# Altium footprint library PCB_IntegratedCircuit.PcbLib: 56 footprints (part 3 of 4)
Each footprint in its own frame and in the unit in brackets; x right, y up, seen from the top. Pads: shape width x height; smd on the part's side, far side on the other; paste and mask are expansions set on the pad; w line width, h text height; cw(c..) or ccw(c..) is an arc to the next point about the centre after c.
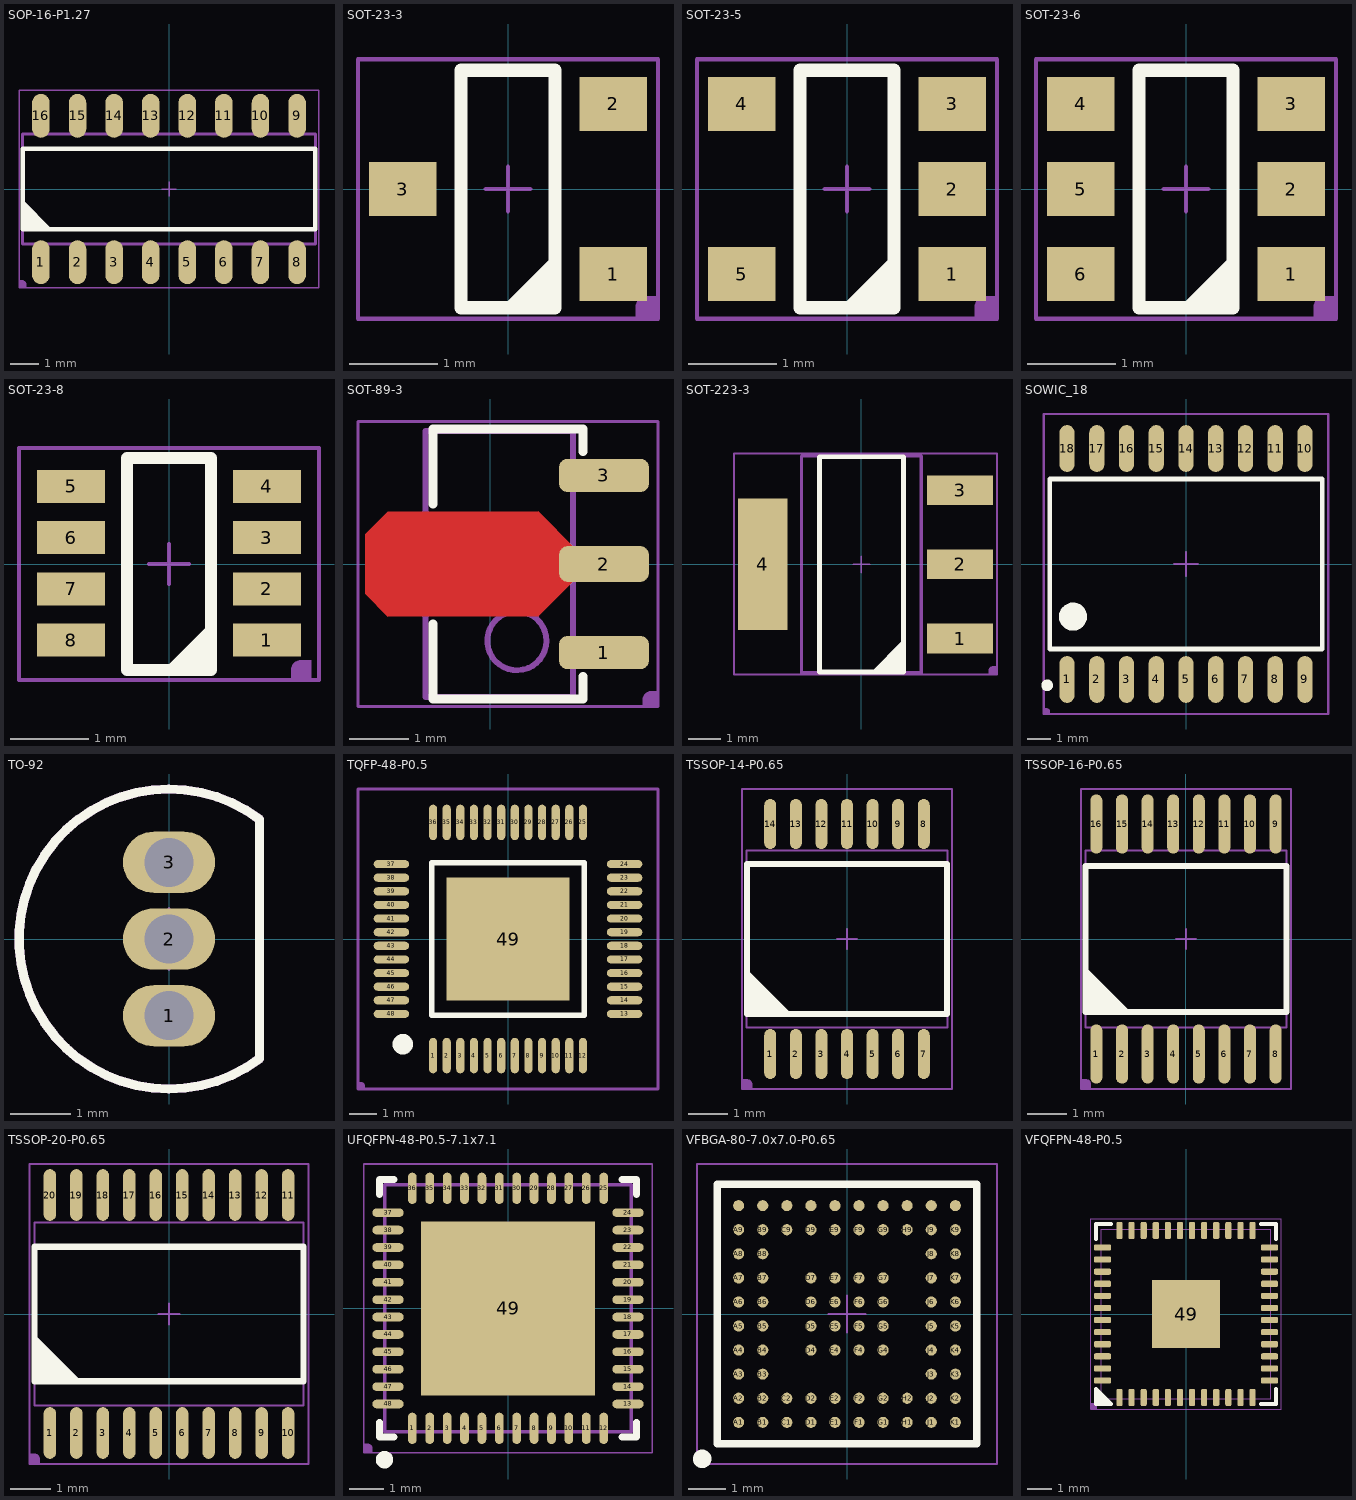
[diagram p2: the footprints below, top view; thin cyan lines are the x and y axes]

## SOP-16-P1.27 [mil]
height 68.9
pads (16):
  oval 24x60 smd: 1(-175,-100) 2(-125,-100) 3(-75,-100) 4(-25,-100) 5(25,-100) 6(75,-100) 7(125,-100) 8(175,-100) 9(175,100) 10(125,100) 11(75,100) 12(25,100) 13(-25,100) 14(-75,100) 15(-125,100) 16(-175,100)
Top Overlay:
  region: -200,-55 -200,-15 -160,-55
  lines w6: -200,-55 -200,55 200,55 200,-55 -200,-55
Top Assembly (Mech13):
  lines w2: -10,0 10,0 ; 0,-10 0,10
  lines w4: -200,-75 200,-75 200,75 -200,75 -200,-75
Top Component:
  region: -205,-135 -205,-125 -200,-125 -199.01,-125 -197.17,-125.76 -195.76,-127.17 -195,-129.01 -195,-130 -195,-135
  lines w2: -205,-135 205,-135 205,135 -205,135 -205,-135
  text ".Designator" at -41,-25 h100
3D body "User Library-SOIC-16-2.STEP": height 68.9, standoff 0, extent -196.85,-118.1 196.85,118.11

## SOT-23-3 [mil]
height 39.5
pads (3):
  rect 30x24 smd: 1(47,-38) 2(47,38) 3(-47,0)
Top Overlay:
  region: 21,-53 -3,-53 21,-29
  lines w6: -21,-53 21,-53 21,53 -21,53 -21,-53
Top Assembly (Mech13):
  lines w2: -10,0 10,0 ; 0,-10 0,10
Top Component:
  region: 67,-58 57,-58 57,-53 57,-52.01 57.76,-50.17 59.17,-48.76 61.01,-48 62,-48 67,-48
  lines w2: -67,-58 -67,58 67,58 67,-58 -67,-58
  text ".Designator" at -41,-20 h80
3D body "User Library-SOT23-3.STEP": height 51.18, standoff 0, extent -55.12,-57.09 55.11,57.09

## SOT-23-5 [mil]
height 62.99
pads (5):
  rect 30x24 smd: 1(47,-38) 2(47,0) 3(47,38) 4(-47,38) 5(-47,-38)
Top Overlay:
  region: 21,-53 -3,-53 21,-29
  lines w6: -21,-53 21,-53 21,53 -21,53 -21,-53
Top Assembly (Mech13):
  lines w2: -10,0 10,0 ; 0,-10 0,10
Top Component:
  region: 67,-58 57,-58 57,-53 57,-52.01 57.76,-50.17 59.17,-48.76 61.01,-48 62,-48 67,-48
  lines w2: -67,-58 -67,58 67,58 67,-58 -67,-58
  text ".Designator" at -41,-20 h80
3D body "User Library-SOT23-5-2.STEP": height 57.09, standoff 0, extent -55.12,-57.09 55.11,57.09

## SOT-23-6 [mil]
height 62.99
pads (6):
  rect 30x24 smd: 1(47,-38) 2(47,0) 3(47,38) 4(-47,38) 5(-47,0) 6(-47,-38)
Top Overlay:
  region: 21,-53 -3,-53 21,-29
  lines w6: -21,-53 21,-53 21,53 -21,53 -21,-53
Top Assembly (Mech13):
  lines w2: -10,0 10,0 ; 0,-10 0,10
Top Component:
  region: 67,-58 57,-58 57,-53 57,-52.01 57.76,-50.17 59.17,-48.76 61.01,-48 62,-48 67,-48
  lines w2: -67,-58 67,-58 67,58 -67,58 -67,-58
  text ".Designator" at -41,-20 h80
3D body "User Library-SOT23-6-2.STEP": height 57.09, standoff 0, extent -55.12,-57.09 55.11,57.09

## SOT-23-8 [mm]
pads (8):
  rect 0.862x0.42 smd: 1(1.244,-0.965) 2(1.244,-0.315) 3(1.244,0.335) 4(1.244,0.985) 5(-1.244,0.985) 6(-1.244,0.335) 7(-1.244,-0.315) 8(-1.244,-0.965)
Top Overlay:
  region: 0.533,-1.346 -0.076,-1.346 0.533,-0.737
  lines w0.152: -0.533,-1.346 0.533,-1.346 0.533,1.346 -0.533,1.346 -0.533,-1.346
Top Assembly (Mech13):
  lines w0.051: -0.254,0 0.254,0 ; 0,-0.254 0,0.254
Top Component:
  region: 1.803,-1.473 1.549,-1.473 1.549,-1.346 1.549,-1.321 1.569,-1.274 1.604,-1.239 1.651,-1.219 1.676,-1.219 1.803,-1.219
  lines w0.051: -1.905,-1.473 1.905,-1.473 1.905,1.473 -1.905,1.473 -1.905,-1.473
  text ".Designator" at -1.041,-0.508 h2.03
3D body "sot-23-8.step": height 1.2, standoff 0, extent -1.406,-1.435 1.394,1.505

## SOT-89-3 [mil]
height 59.06
pads (3):
  rrect50% 60x22 smd: 1(75.81,-59.06) 3(75.81,59.06)
  rrect50% 60x24 smd: 2(75.81,0)
Top Layer:
  region: 56.81,-10 31.81,-35 -68.19,-35 -83.19,-20 -83.19,20 -68.19,35 31.81,35 56.81,10
Top Overlay:
  lines w6: -38.19,-40 -38.19,-90 61.81,-90 61.81,-75 ; -38.19,40 -38.19,90 61.81,90 61.81,75
Top Assembly (Mech13):
  circle w3.94: c17.72,-51.18 r19.68
  lines w3.94: -13.78,0 25.59,0 ; 5.91,-19.68 5.91,19.69 ; -43.31,-88.58 55.12,-88.58 55.12,88.58 -43.31,88.58 -43.31,-88.58
Top Component:
  region: 111.81,-95 101.81,-95 101.81,-90 101.81,-89.01 102.57,-87.17 103.98,-85.76 105.82,-85 106.81,-85 111.81,-85
  lines w2: -88.19,-95 111.81,-95 111.81,95 -88.19,95 -88.19,-95
  text ".Designator" at -41,-25 h100
3D body "SOT89-150P410X150-3N.step": height 60.06, standoff 1, extent -63,-88.45 94.48,88.44

## SOT-223-3 [mil]
height 70.87
pads (4):
  rect 80x36 smd: 1(120,-90.16) 2(120,0) 3(120,90.16)
  rect 60x160 smd: 4(-120,0)
Top Overlay:
  region: 51.18,-131 11.81,-131 51.18,-91.63
  lines w6: -51.18,-131 -51.18,131 51.18,131 51.18,-131 -51.18,-131
Top Assembly (Mech13):
  lines w2: -10,0 10,0 ; 0,-10 0,10
  lines w3.94: -72.83,-131.89 -72.83,131.89 72.83,131.89 72.83,-131.89 -72.83,-131.89
Top Component:
  region: 165,-134 155,-134 155,-129 155,-128.01 155.76,-126.17 157.17,-124.76 159.01,-124 160,-124 165,-124
  lines w2: -155,-134 -155,135 165,135 165,-134 -155,-134
  text ".Designator" at -41,-25 h100
3D body "SOT223-4.STEP": height 70.87, standoff 0, extent -143.71,-131.88 143.69,131.9

## SOWIC_18 [mm]
pads (18):
  oval 0.65x2 smd: 1(-5.08,-4.933) 2(-3.81,-4.933) 3(-2.54,-4.933) 4(-1.27,-4.933) 5(0,-4.933) 6(1.27,-4.933) 7(2.54,-4.933) 8(3.81,-4.933) 9(5.08,-4.933) 10(5.08,4.933) 11(3.81,4.933) 12(2.54,4.933) 13(1.27,4.933) 14(0,4.933) 15(-1.27,4.933) 16(-2.54,4.933) 17(-3.81,4.933) 18(-5.08,4.933)
Top Overlay:
  circle w0.25: c-5.93,-5.183 r0.125
  circle w0.6: c-4.825,-2.25 r0.3
  lines w0.2: -5.825,-3.632 5.825,-3.632 5.825,3.632 -5.825,3.632 -5.825,-3.632
Top Assembly (Mech13):
  lines w0.1: -0.5,0 0.5,0 ; 0,-0.5 0,0.5
Top Component:
  region: -6.075,-6.408 -6.075,-6.154 -5.948,-6.154 -5.923,-6.154 -5.876,-6.174 -5.84,-6.209 -5.821,-6.256 -5.821,-6.281 -5.821,-6.408
  lines w0.1: -6.075,-6.408 6.075,-6.408 6.075,6.408 -6.075,6.408 -6.075,-6.408
  text ".Designator" at -1.041,-0.508 h2.03
3D body "SOIC-18-300.STEP": height 2.57, standoff -0.03, extent -5.875,-5.3 5.875,5.3

## TO-92 [mil]
pads (3):
  oval 60x40 hole 32: 1(0,-50) 2(0,0) 3(0,50)
Top Overlay:
  lines w6: 59.06,-77.95 cw(c0,0) 59.06,77.95 59.05,-77.95
Top Assembly (Mech13):
  lines w2: -10,0 10,0 ; 0,-10 0,10
  lines w6: 59.06,-77.95 cw(c0,0) 59.06,77.95 59.05,-77.95
Bottom Component:
  lines w2: -20,0 20,0 ; 0,-20 0,20
3D body "SW3dPS-TO-92.STEP": height 405.76, standoff -228.35, extent -120,-124.1 69.37,120

## TQFP-48-P0.5 [mm]
height 1.6
pads (49):
  oval 0.3x1.3 smd: 1(-2.75,-4.28) 2(-2.25,-4.28) 3(-1.75,-4.28) 4(-1.25,-4.28) 5(-0.75,-4.28) 6(-0.25,-4.28) 7(0.25,-4.28) 8(0.75,-4.28) 9(1.25,-4.28) 10(1.75,-4.28) 11(2.25,-4.28) 12(2.75,-4.28) 25(2.75,4.28) 26(2.25,4.28) 27(1.75,4.28) 28(1.25,4.28) 29(0.75,4.28) 30(0.25,4.28) 31(-0.25,4.28) 32(-0.75,4.28) 33(-1.25,4.28) 34(-1.75,4.28) 35(-2.25,4.28) 36(-2.75,4.28)
  oval 1.3x0.3 smd: 13(4.28,-2.75) 14(4.28,-2.25) 15(4.28,-1.75) 16(4.28,-1.25) 17(4.28,-0.75) 18(4.28,-0.25) 19(4.28,0.25) 20(4.28,0.75) 21(4.28,1.25) 22(4.28,1.75) 23(4.28,2.25) 24(4.28,2.75) 37(-4.28,2.75) 38(-4.28,2.25) 39(-4.28,1.75) 40(-4.28,1.25) 41(-4.28,0.75) 42(-4.28,0.25) 43(-4.28,-0.25) 44(-4.28,-0.75) 45(-4.28,-1.25) 46(-4.28,-1.75) 47(-4.28,-2.25) 48(-4.28,-2.75)
  rect 4.5x4.5 smd: 49(0,0)
Top Overlay:
  circle w0.5: c-3.859,-3.861 r0.125
  lines w0.2: -2.8,-2.8 2.8,-2.8 2.8,2.8 -2.8,2.8 -2.8,-2.8
Top Assembly (Mech13):
  lines w0.1: -0.5,0 0.5,0 ; 0,-0.5 0,0.5
Top Component:
  region: -5.505,-5.505 -5.505,-5.251 -5.378,-5.251 -5.353,-5.251 -5.306,-5.27 -5.27,-5.306 -5.251,-5.353 -5.251,-5.378 -5.251,-5.505
  lines w0.1: -5.505,-5.505 5.505,-5.505 5.505,5.505 -5.505,5.505 -5.505,-5.505
  text ".Designator" at -1.041,-0.61 h2.54
3D body "LQFP_48.STEP": height 1.52, standoff -0.01, extent -4.499,-4.499 4.499,4.499

## TSSOP-14-P0.65 [mil]
height 47.24
pads (14):
  oval 12x50 smd: 1(-76.77,-115) 2(-51.18,-115) 3(-25.59,-115) 4(0,-115) 5(25.59,-115) 6(51.18,-115) 7(76.77,-115) 8(76.77,115) 9(51.18,115) 10(25.59,115) 11(0,115) 12(-25.59,115) 13(-51.18,115) 14(-76.77,115)
Top Overlay:
  region: -100.47,-75 -100.47,-30 -55.47,-75
  lines w6: -100,-75 100,-75 100,75 -100,75 -100,-75
Top Assembly (Mech13):
  lines w2.01: -10,0 10,0 ; 0,-10 0,10 ; -100.39,-88.58 100.39,-88.58 100.39,88.58 -100.39,88.58 -100.39,-88.58
Top Component:
  region: -105,-150 -105,-140 -100,-140 -99.01,-140 -97.17,-140.76 -95.76,-142.17 -95,-144.01 -95,-145 -95,-150
  lines w2: -105,-150 105,-150 105,150 -105,150 -105,-150
  text ".Designator" at -41,-20 h80
3D body "User Library-tssop14-2.STEP": height 47.24, standoff 0, extent -100.4,-125.98 100.39,125.99

## TSSOP-16-P0.65 [mm]
height 1.2
pads (16):
  oval 0.305x1.5 smd: 1(-2.275,-2.921) 2(-1.625,-2.921) 3(-0.975,-2.921) 4(-0.325,-2.921) 5(0.325,-2.921) 6(0.975,-2.921) 7(1.625,-2.921) 8(2.275,-2.921) 9(2.275,2.921) 10(1.625,2.921) 11(0.975,2.921) 12(0.325,2.921) 13(-0.325,2.921) 14(-0.975,2.921) 15(-1.625,2.921) 16(-2.275,2.921)
Top Overlay:
  region: -2.562,-1.85 -2.562,-0.707 -1.419,-1.85
  lines w0.152: -2.55,-1.85 2.55,-1.85 2.55,1.85 -2.55,1.85 -2.55,-1.85
Top Assembly (Mech13):
  lines w0.051: -0.254,0 0.254,0 ; 0,-0.254 0,0.254 ; -2.55,-2.25 2.55,-2.25 2.55,2.25 -2.55,2.25 -2.55,-2.25
Top Component:
  region: -2.667,-3.81 -2.667,-3.556 -2.54,-3.556 -2.515,-3.556 -2.468,-3.575 -2.432,-3.611 -2.413,-3.658 -2.413,-3.683 -2.413,-3.81
  lines w0.051: -2.667,-3.81 -2.667,3.81 2.667,3.81 2.667,-3.81 -2.667,-3.81
  text ".Designator" at -1.041,-0.508 h2.03
3D body "User Library-tssop16-2.STEP": height 1.2, standoff 0, extent -2.55,-3.2 2.55,3.2

## TSSOP-20-P0.65 [mil]
height 47.24
pads (20):
  oval 12x50 smd: 1(-115.16,-115) 2(-89.57,-115) 3(-63.98,-115) 4(-38.39,-115) 5(-12.8,-115) 6(12.8,-115) 7(38.39,-115) 8(63.98,-115) 9(89.57,-115) 10(115.16,-115) 11(115.16,115) 12(89.57,115) 13(63.98,115) 14(38.39,115) 15(12.8,115) 16(-12.8,115) 17(-38.39,115) 18(-63.98,115) 19(-89.57,115) 20(-115.16,115)
Top Overlay:
  region: -130,-65 -130,-20 -85,-65
  lines w6: -130,-65 130,-65 130,65 -130,65 -130,-65
Top Assembly (Mech13):
  lines w2.01: -10,0 10,0 ; 0,-10 0,10 ; -129.92,-88.58 129.92,-88.58 129.92,88.58 -129.92,88.58 -129.92,-88.58
Top Component:
  region: -135,-145 -135,-135 -130,-135 -129.01,-135 -127.17,-135.76 -125.76,-137.17 -125,-139.01 -125,-140 -125,-145
  lines w2: -135,-145 -135,145 135,145 135,-145 -135,-145
  text ".Designator" at -41,-20 h80
3D body "User Library-TSSOP-20 6_6x4_4.STEP": height 41.69, standoff -1.62, extent -129.93,-125.98 129.91,125.99

## UFQFPN-48-P0.5-7.1x7.1 [mm] "QFN, 48-Leads, Body 7.1x7.1mm, Pitch 0.5mm, Thermal Pad 5.6x5.6mm, IPC Medium Density"
height 0.6
pads (49):
  oval 0.25x0.9 smd: 1(-2.75,-3.45) 2(-2.25,-3.45) 3(-1.75,-3.45) 4(-1.25,-3.45) 5(-0.75,-3.45) 6(-0.25,-3.45) 7(0.25,-3.45) 8(0.75,-3.45) 9(1.25,-3.45) 10(1.75,-3.45) 11(2.25,-3.45) 12(2.75,-3.45) 25(2.75,3.45) 26(2.25,3.45) 27(1.75,3.45) 28(1.25,3.45) 29(0.75,3.45) 30(0.25,3.45) 31(-0.25,3.45) 32(-0.75,3.45) 33(-1.25,3.45) 34(-1.75,3.45) 35(-2.25,3.45) 36(-2.75,3.45)
  oval 0.9x0.25 smd: 13(3.45,-2.75) 14(3.45,-2.25) 15(3.45,-1.75) 16(3.45,-1.25) 17(3.45,-0.75) 18(3.45,-0.25) 19(3.45,0.25) 20(3.45,0.75) 21(3.45,1.25) 22(3.45,1.75) 23(3.45,2.25) 24(3.45,2.75) 37(-3.45,2.75) 38(-3.45,2.25) 39(-3.45,1.75) 40(-3.45,1.25) 41(-3.45,0.75) 42(-3.45,0.25) 43(-3.45,-0.25) 44(-3.45,-0.75) 45(-3.45,-1.25) 46(-3.45,-1.75) 47(-3.45,-2.25) 48(-3.45,-2.75)
  rect 5x5 smd: 49(0,0)
Top Overlay:
  circle w0.25: c-3.55,-4.35 r0.125
  lines w0.2: -3.7,-3.275 -3.7,-3.7 -3.275,-3.7 ; -3.7,3.275 -3.7,3.7 -3.275,3.7 ; 3.275,-3.7 3.7,-3.7 3.7,-3.275 ; 3.275,3.7 3.7,3.7 3.7,3.275
Top Assembly (Mech13):
  lines w0.1: -0.5,0 0.5,0 ; 0,-0.5 0,0.5 ; -3.55,-3.55 -3.55,3.55 3.55,3.55 3.55,-3.55 -3.55,-3.55
Top Component:
  region: -4.15,-4.15 -4.15,-3.896 -4.023,-3.896 -3.998,-3.896 -3.951,-3.915 -3.915,-3.951 -3.896,-3.998 -3.896,-4.023 -3.896,-4.15
  lines w0.05: -4.15,-4.15 -4.15,4.15 4.15,4.15 4.15,-4.15 -4.15,-4.15
  text ".Designator" at -0.864,-0.508 h2.03
3D body: height 0.6, standoff 0, extent -3.55,-3.55 3.55,3.55

## VFBGA-80-7.0x7.0-P0.65 [mm]
pads (80):
  round 0.3 smd paste+0 mask+0: A1(-2.925,-2.925) A2(-2.925,-2.275) A3(-2.925,-1.625) A4(-2.925,-0.975) A5(-2.925,-0.325) A6(-2.925,0.325) A7(-2.925,0.975) A8(-2.925,1.625) A9(-2.925,2.275) A10(-2.925,2.925) B1(-2.275,-2.925) B2(-2.275,-2.275) B3(-2.275,-1.625) B4(-2.275,-0.975) B5(-2.275,-0.325) B6(-2.275,0.325) B7(-2.275,0.975) B8(-2.275,1.625) B9(-2.275,2.275) B10(-2.275,2.925) C1(-1.625,-2.925) C2(-1.625,-2.275) C9(-1.625,2.275) C10(-1.625,2.925) D1(-0.975,-2.925) D2(-0.975,-2.275) D4(-0.975,-0.975) D5(-0.975,-0.325) D6(-0.975,0.325) D7(-0.975,0.975) D9(-0.975,2.275) D10(-0.975,2.925) E1(-0.325,-2.925) E2(-0.325,-2.275) E4(-0.325,-0.975) E5(-0.325,-0.325) E6(-0.325,0.325) E7(-0.325,0.975) E9(-0.325,2.275) E10(-0.325,2.925) F1(0.325,-2.925) F2(0.325,-2.275) F4(0.325,-0.975) F5(0.325,-0.325) F6(0.325,0.325) F7(0.325,0.975) F9(0.325,2.275) F10(0.325,2.925) G1(0.975,-2.925) G2(0.975,-2.275) G4(0.975,-0.975) G5(0.975,-0.325) G6(0.975,0.325) G7(0.975,0.975) G9(0.975,2.275) G10(0.975,2.925) H1(1.625,-2.925) H2(1.625,-2.275) H9(1.625,2.275) H10(1.625,2.925) J1(2.275,-2.925) J2(2.275,-2.275) J3(2.275,-1.625) J4(2.275,-0.975) J5(2.275,-0.325) J6(2.275,0.325) J7(2.275,0.975) J8(2.275,1.625) J9(2.275,2.275) J10(2.275,2.925) K1(2.925,-2.925) K2(2.925,-2.275) K3(2.925,-1.625) K4(2.925,-0.975) K5(2.925,-0.325) K6(2.925,0.325) K7(2.925,0.975) K8(2.925,1.625) K9(2.925,2.275) K10(2.925,2.925)
Top Overlay:
  circle w0.25: c-3.912,-3.912 r0.125
  lines w0.2: -3.5,-3.5 -3.5,3.5 3.5,3.5 3.5,-3.5 -3.5,-3.5
Mechanical 12:
  lines w0.15: -3.5,-3.5 -3.5,3.5 3.5,3.5 3.5,-3.5 -3.5,-3.5
Top Assembly (Mech13):
  lines w0.051: -0.5,0 0.5,0 ; 0,-0.5 0,0.5 ; -3.5,-3.5 3.5,-3.5 3.5,3.505 -3.5,3.505 -3.5,-3.5
Top Component:
  region: -4.05,-4.05 -4.05,-3.796 -3.923,-3.796 -3.898,-3.796 -3.851,-3.815 -3.815,-3.851 -3.796,-3.898 -3.796,-3.923 -3.796,-4.05
  lines w0.051: -4.05,-4.05 4.05,-4.05 4.05,4.05 -4.05,4.05 -4.05,-4.05
  text ".Designator" at -0.838,-0.508 h2.03
3D body "U2.step": height 1, standoff 0, extent -3.5,-3.5 3.5,3.5

## VFQFPN-48-P0.5 [mil]
height 21.65
pads (49):
  rrect50% 10x28 smd: 1(-108.27,-136) 2(-88.58,-136) 3(-68.9,-136) 4(-49.21,-136) 5(-29.53,-136) 6(-9.84,-136) 7(9.84,-136) 8(29.53,-136) 9(49.21,-136) 10(68.9,-136) 11(88.58,-136) 12(108.27,-136) 25(108.27,136) 26(88.58,136) 27(68.9,136) 28(49.21,136) 29(29.53,136) 30(9.84,136) 31(-9.84,136) 32(-29.53,136) 33(-49.21,136) 34(-68.9,136) 35(-88.58,136) 36(-108.27,136)
  rrect50% 28x10 smd: 13(136,-108.27) 14(136,-88.58) 15(136,-68.9) 16(136,-49.21) 17(136,-29.53) 18(136,-9.84) 19(136,9.84) 20(136,29.53) 21(136,49.21) 22(136,68.9) 23(136,88.58) 24(136,108.27) 37(-136,108.27) 38(-136,88.58) 39(-136,68.9) 40(-136,49.21) 41(-136,29.53) 42(-136,9.84) 43(-136,-9.84) 44(-136,-29.53) 45(-136,-49.21) 46(-136,-68.9) 47(-136,-88.58) 48(-136,-108.27)
  rect 110.24x110.24 smd: 49(0,0)
Top Overlay:
  region: -146.67,-146.67 -146.67,-122 -122,-146.67
  lines w6: -146.67,122 -146.67,146.67 -122,146.67 ; 122,-146.67 146.67,-146.67 146.67,-122 ; 122,146.67 146.67,146.67 146.67,122 ; -146.67,-146.67 -122,-146.67 -146.67,-122 -146.67,-146.67
Top Solder:
  rectangle: -150,-108.27 -122,108.27
  region: -108.27,150 -108.27,122 108.27,122 108.27,150
  region: 150,108.27 122,108.27 122,-108.27 150,-108.27
  region: 108.27,-150 108.27,-122 -108.27,-122 -108.27,-150
Top Assembly (Mech13):
  lines w2: -10,0 10,0 ; 0,-10 0,10 ; -137.8,-137.79 -137.8,137.8 137.8,137.8 137.8,-137.79 -137.8,-137.79
Top Component:
  region: -155,-155 -155,-145 -150,-145 -149.01,-145 -147.17,-145.76 -145.76,-147.17 -145,-149.01 -145,-150 -145,-155
  lines w2: -155,-155 -155,155 155,155 155,-155 -155,-155
  text ".Designator" at -41,-20 h80
3D body "QFN50P700X700X55-48L.step": height 21.65, standoff 0, extent -138.59,-138.58 138.58,138.58